# Altium schematic symbol library Regulator_Linear.SchLib: 1452 symbols (part 10 of 10)
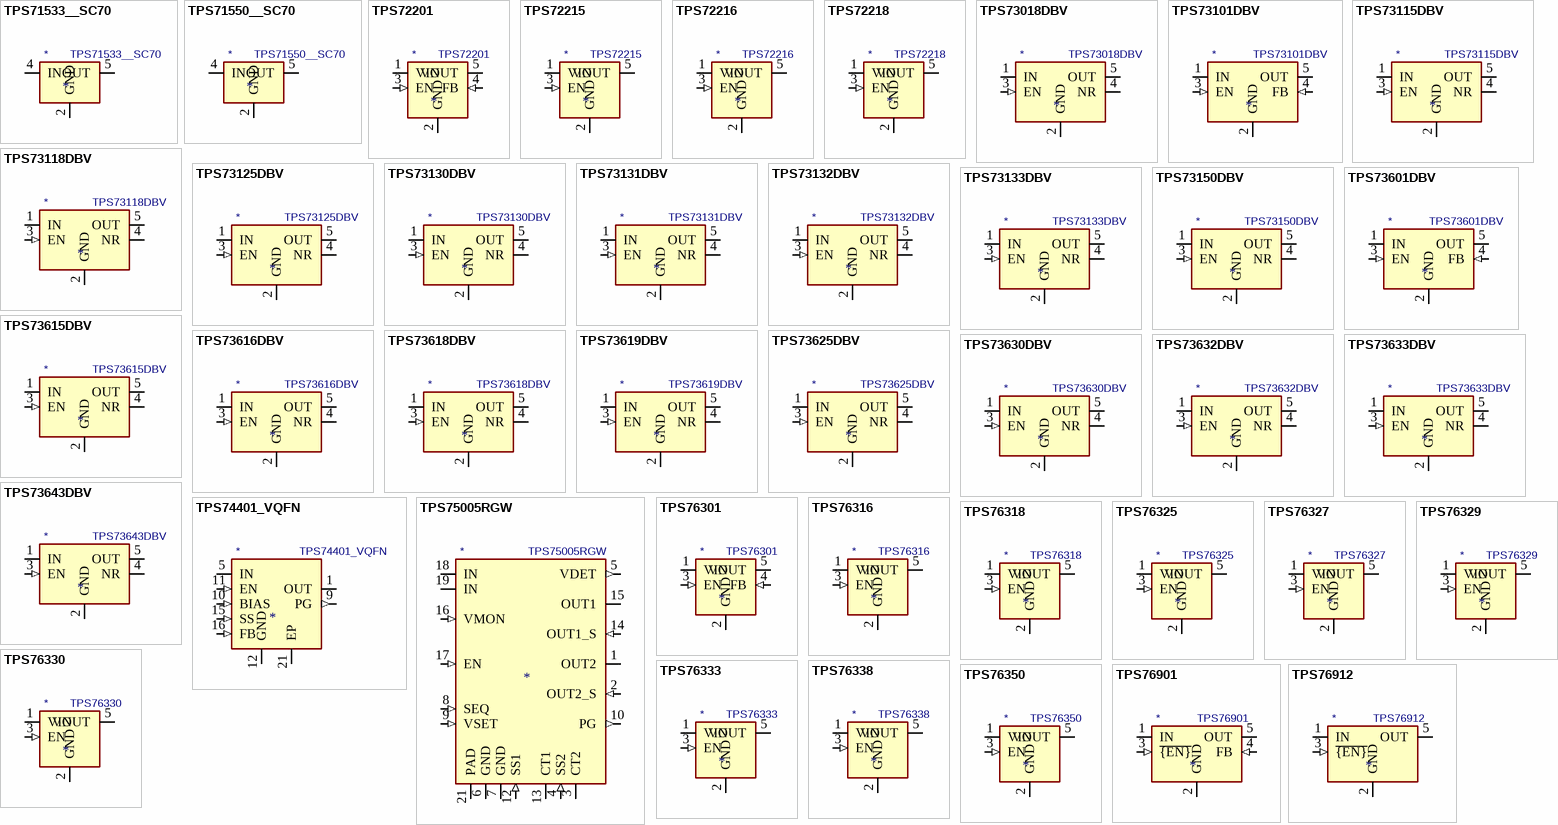
[diagram p45: symbols TPS71533__SC70 to TPS76912]

## TPS76327
designator *  value TPS76327
ki_keywords: linear low dropout Regulator fixed; ki_description: Low power 150mA LDO 2.7V fixed output voltage, SOT-23-5; ki_fp_filters: SOT?23*; Footprint: Package_TO_SOT_SMD:SOT-23-5; Supplier: http://www.ti.com/lit/ds/symlink/tps763.pdf
footprint SOT-23-5
pins: 1 VIN (power), 2 GND (power), 3 EN (in), 4 NC (in) hidden, 5 VOUT (power)

## TPS76329
designator *  value TPS76329
ki_keywords: linear low dropout Regulator fixed; ki_description: Low power 150mA LDO 2.8V fixed output voltage, SOT-23-5; ki_fp_filters: SOT?23*; Footprint: Package_TO_SOT_SMD:SOT-23-5; Supplier: http://www.ti.com/lit/ds/symlink/tps763.pdf
footprint SOT-23-5
pins: 1 VIN (power), 2 GND (power), 3 EN (in), 4 NC (in) hidden, 5 VOUT (power)

## TPS76330
designator *  value TPS76330
ki_keywords: linear low dropout Regulator fixed; ki_description: Low power 150mA LDO 3.0V fixed output voltage, SOT-23-5; ki_fp_filters: SOT?23*; Footprint: Package_TO_SOT_SMD:SOT-23-5; Supplier: http://www.ti.com/lit/ds/symlink/tps763.pdf
footprint SOT-23-5
pins: 1 VIN (power), 2 GND (power), 3 EN (in), 4 NC (in) hidden, 5 VOUT (power)

## TPS76333
designator *  value TPS76333
ki_keywords: linear low dropout Regulator fixed; ki_description: Low power 150mA LDO 3.3V fixed output voltage, SOT-23-5; ki_fp_filters: SOT?23*; Footprint: Package_TO_SOT_SMD:SOT-23-5; Supplier: http://www.ti.com/lit/ds/symlink/tps763.pdf
footprint SOT-23-5
pins: 1 VIN (power), 2 GND (power), 3 EN (in), 4 NC (in) hidden, 5 VOUT (power)

## TPS76338
designator *  value TPS76338
ki_keywords: linear low dropout Regulator fixed; ki_description: Low power 150mA LDO 3.8V fixed output voltage, SOT-23-5; ki_fp_filters: SOT?23*; Footprint: Package_TO_SOT_SMD:SOT-23-5; Supplier: http://www.ti.com/lit/ds/symlink/tps763.pdf
footprint SOT-23-5
pins: 1 VIN (power), 2 GND (power), 3 EN (in), 4 NC (in) hidden, 5 VOUT (power)

## TPS76350
designator *  value TPS76350
ki_keywords: linear low dropout Regulator fixed; ki_description: Low power 150mA LDO 5.0V fixed output voltage, SOT-23-5; ki_fp_filters: SOT?23*; Footprint: Package_TO_SOT_SMD:SOT-23-5; Supplier: http://www.ti.com/lit/ds/symlink/tps763.pdf
footprint SOT-23-5
pins: 1 VIN (power), 2 GND (power), 3 EN (in), 4 NC (in) hidden, 5 VOUT (power)

## TPS76901
designator *  value TPS76901
ki_keywords: Ultra Low Power Adjustable LDO 100mA; ki_description: Ultra Low Power 100mA Low Drop Adjustable Out Regulator, SOT-23-5; ki_fp_filters: SOT?23*; Footprint: Package_TO_SOT_SMD:SOT-23-5; Supplier: http://www.ti.com/lit/ds/symlink/tps769.pdf
footprint SOT-23-5
pins: 1 IN (power), 2 GND (power), 3 ~{{EN}} (in), 4 FB (in), 5 OUT (power)

## TPS76912
designator *  value TPS76912
ki_keywords: Ultra Low Power Fixed LDO 100mA; ki_description: Ultra Low Power 100mA Low Drop Out Regulator 1.2V, SOT-23-5; ki_fp_filters: SOT?23*; Footprint: Package_TO_SOT_SMD:SOT-23-5; Supplier: http://www.ti.com/lit/ds/symlink/tps769.pdf
footprint SOT-23-5
pins: 1 IN (power), 2 GND (power), 3 ~{{EN}} (in), 4 NC (in) hidden, 5 OUT (power)

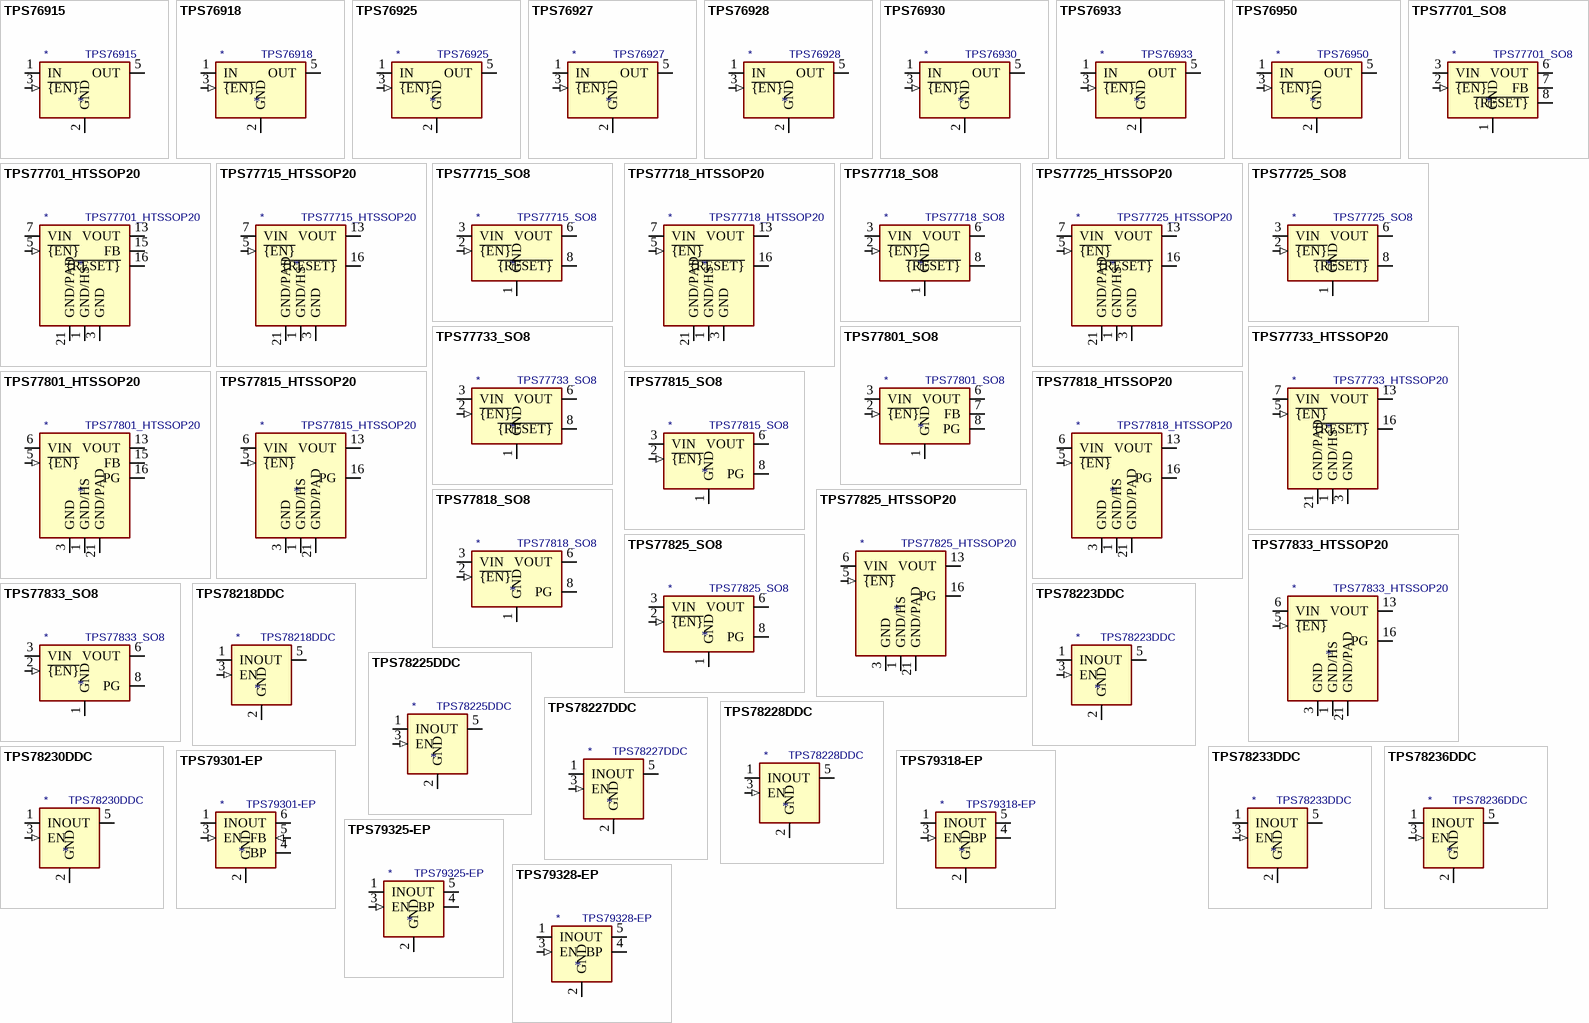
[diagram p35: symbols TPS76915 to TPS79328-EP]

## TPS76915
designator *  value TPS76915
ki_keywords: Ultra Low Power Fixed LDO 100mA; ki_description: Ultra Low Power 100mA Low Drop Out Regulator 1.5V, SOT-23-5; ki_fp_filters: SOT?23*; Footprint: Package_TO_SOT_SMD:SOT-23-5; Supplier: http://www.ti.com/lit/ds/symlink/tps769.pdf
footprint SOT-23-5
pins: 1 IN (power), 2 GND (power), 3 ~{{EN}} (in), 4 NC (in) hidden, 5 OUT (power)

## TPS76918
designator *  value TPS76918
ki_keywords: Ultra Low Power Fixed LDO 100mA; ki_description: Ultra Low Power 100mA Low Drop Out Regulator 1.8V, SOT-23-5; ki_fp_filters: SOT?23*; Footprint: Package_TO_SOT_SMD:SOT-23-5; Supplier: http://www.ti.com/lit/ds/symlink/tps769.pdf
footprint SOT-23-5
pins: 1 IN (power), 2 GND (power), 3 ~{{EN}} (in), 4 NC (in) hidden, 5 OUT (power)

## TPS76925
designator *  value TPS76925
ki_keywords: Ultra Low Power Fixed LDO 100mA; ki_description: Ultra Low Power 100mA Low Drop Out Regulator 2.5V, SOT-23-5; ki_fp_filters: SOT?23*; Footprint: Package_TO_SOT_SMD:SOT-23-5; Supplier: http://www.ti.com/lit/ds/symlink/tps769.pdf
footprint SOT-23-5
pins: 1 IN (power), 2 GND (power), 3 ~{{EN}} (in), 4 NC (in) hidden, 5 OUT (power)

## TPS76927
designator *  value TPS76927
ki_keywords: Ultra Low Power Fixed LDO 100mA; ki_description: Ultra Low Power 100mA Low Drop Out Regulator 2.7V, SOT-23-5; ki_fp_filters: SOT?23*; Footprint: Package_TO_SOT_SMD:SOT-23-5; Supplier: http://www.ti.com/lit/ds/symlink/tps769.pdf
footprint SOT-23-5
pins: 1 IN (power), 2 GND (power), 3 ~{{EN}} (in), 4 NC (in) hidden, 5 OUT (power)

## TPS76928
designator *  value TPS76928
ki_keywords: Ultra Low Power Fixed LDO 100mA; ki_description: Ultra Low Power 100mA Low Drop Out Regulator 2.8V, SOT-23-5; ki_fp_filters: SOT?23*; Footprint: Package_TO_SOT_SMD:SOT-23-5; Supplier: http://www.ti.com/lit/ds/symlink/tps769.pdf
footprint SOT-23-5
pins: 1 IN (power), 2 GND (power), 3 ~{{EN}} (in), 4 NC (in) hidden, 5 OUT (power)

## TPS76930
designator *  value TPS76930
ki_keywords: Ultra Low Power Fixed LDO 100mA; ki_description: Ultra Low Power 100mA Low Drop Out Regulator 3.0V, SOT-23-5; ki_fp_filters: SOT?23*; Footprint: Package_TO_SOT_SMD:SOT-23-5; Supplier: http://www.ti.com/lit/ds/symlink/tps769.pdf
footprint SOT-23-5
pins: 1 IN (power), 2 GND (power), 3 ~{{EN}} (in), 4 NC (in) hidden, 5 OUT (power)

## TPS76933
designator *  value TPS76933
ki_keywords: Ultra Low Power Fixed LDO 100mA; ki_description: Ultra Low Power 100mA Low Drop Out Regulator 3.3V, SOT-23-5; ki_fp_filters: SOT?23*; Footprint: Package_TO_SOT_SMD:SOT-23-5; Supplier: http://www.ti.com/lit/ds/symlink/tps769.pdf
footprint SOT-23-5
pins: 1 IN (power), 2 GND (power), 3 ~{{EN}} (in), 4 NC (in) hidden, 5 OUT (power)

## TPS76950
designator *  value TPS76950
ki_keywords: Ultra Low Power Fixed LDO 100mA 5V; ki_description: Ultra Low Power 100mA Low Drop Out Regulator 5.0V, SOT-23-5; ki_fp_filters: SOT?23*; Footprint: Package_TO_SOT_SMD:SOT-23-5; Supplier: http://www.ti.com/lit/ds/symlink/tps769.pdf
footprint SOT-23-5
pins: 1 IN (power), 2 GND (power), 3 ~{{EN}} (in), 4 NC (in) hidden, 5 OUT (power)

## TPS77701_HTSSOP20
designator *  value TPS77701_HTSSOP20
ki_keywords: 750mA LDO Regulator Adjustable Positive; ki_description: 750mA Fast-Transient Low Dropout Voltage Regulator, Adjustable Output 1.5-5.5V, HTSSOP20; ki_fp_filters: HTSSOP*4.4x6.5mm*P0.65mm*; Footprint: Package_SO:HTSSOP-20-1EP_4.4x6.5mm_P0.65mm_EP3.4x6.5mm_ThermalVias; Supplier: http://www.ti.com/lit/ds/symlink/tps777.pdf
footprint HTSSOP-20-1EP_4.4x6.5mm_P0.65mm_EP3.4x6.5mm_ThermalVias
pins: 1 GND/HS (power), 2 GND/HS hidden, 3 GND (power), 4 NC (in) hidden, 5 ~{{EN}} (in), 6 VIN hidden, 7 VIN (power), 8 NC (in) hidden, 9 GND/HS hidden, 10 GND/HS hidden, 11 GND/HS hidden, 12 GND/HS hidden, 13 VOUT (power), 14 VOUT hidden, 15 FB, 16 ~{{RESET}} (oc), 17 NC (in) hidden, 18 NC (in) hidden, 19 GND/HS hidden, 20 GND/HS hidden, 21 GND/PAD (power)

## TPS77701_SO8
designator *  value TPS77701_SO8
ki_keywords: 750mA LDO Regulator Adjustable Positive; ki_description: 750mA Fast-Transient Low Dropout Voltage Regulator, Adjustable Output 1.5-5.5V, SO-8; ki_fp_filters: SOIC*3.9x4.9mm*P1.27mm*; Footprint: Package_SO:SOIC-8_3.9x4.9mm_P1.27mm; Supplier: http://www.ti.com/lit/ds/symlink/tps777.pdf
footprint SOIC-8_3.9x4.9mm_P1.27mm
pins: 1 GND (power), 2 ~{{EN}} (in), 3 VIN (power), 4 VIN hidden, 5 VOUT hidden, 6 VOUT (power), 7 FB, 8 ~{{RESET}} (oc)

## TPS77715_HTSSOP20
designator *  value TPS77715_HTSSOP20
ki_keywords: 750mA LDO Regulator Fixed Positive; ki_description: 750mA Fast-Transient Low Dropout Voltage Regulator, Fixed Output 1.5V, HTSSOP20; ki_fp_filters: HTSSOP*4.4x6.5mm*P0.65mm*; Footprint: Package_SO:HTSSOP-20-1EP_4.4x6.5mm_P0.65mm_EP3.4x6.5mm_ThermalVias; Supplier: http://www.ti.com/lit/ds/symlink/tps777.pdf
footprint HTSSOP-20-1EP_4.4x6.5mm_P0.65mm_EP3.4x6.5mm_ThermalVias
pins: 1 GND/HS (power), 2 GND/HS hidden, 3 GND (power), 4 NC (in) hidden, 5 ~{{EN}} (in), 6 VIN hidden, 7 VIN (power), 8 NC (in) hidden, 9 GND/HS hidden, 10 GND/HS hidden, 11 GND/HS hidden, 12 GND/HS hidden, 13 VOUT (power), 14 VOUT hidden, 15 NC (in) hidden, 16 ~{{RESET}} (oc), 17 NC (in) hidden, 18 NC (in) hidden, 19 GND/HS hidden, 20 GND/HS hidden, 21 GND/PAD (power)

## TPS77715_SO8
designator *  value TPS77715_SO8
ki_keywords: 750mA LDO Regulator Fixed Positive; ki_description: 750mA Fast-Transient Low Dropout Voltage Regulator, Fixed Output 1.5V, SO-8; ki_fp_filters: SOIC*3.9x4.9mm*P1.27mm*; Footprint: Package_SO:SOIC-8_3.9x4.9mm_P1.27mm; Supplier: http://www.ti.com/lit/ds/symlink/tps777.pdf
footprint SOIC-8_3.9x4.9mm_P1.27mm
pins: 1 GND (power), 2 ~{{EN}} (in), 3 VIN (power), 4 VIN hidden, 5 VOUT hidden, 6 VOUT (power), 7 NC (in) hidden, 8 ~{{RESET}} (oc)

## TPS77718_HTSSOP20
designator *  value TPS77718_HTSSOP20
ki_keywords: 750mA LDO Regulator Fixed Positive; ki_description: 750mA Fast-Transient Low Dropout Voltage Regulator, Fixed Output 1.8V, HTSSOP20; ki_fp_filters: HTSSOP*4.4x6.5mm*P0.65mm*; Footprint: Package_SO:HTSSOP-20-1EP_4.4x6.5mm_P0.65mm_EP3.4x6.5mm_ThermalVias; Supplier: http://www.ti.com/lit/ds/symlink/tps777.pdf
footprint HTSSOP-20-1EP_4.4x6.5mm_P0.65mm_EP3.4x6.5mm_ThermalVias
pins: 1 GND/HS (power), 2 GND/HS hidden, 3 GND (power), 4 NC (in) hidden, 5 ~{{EN}} (in), 6 VIN hidden, 7 VIN (power), 8 NC (in) hidden, 9 GND/HS hidden, 10 GND/HS hidden, 11 GND/HS hidden, 12 GND/HS hidden, 13 VOUT (power), 14 VOUT hidden, 15 NC (in) hidden, 16 ~{{RESET}} (oc), 17 NC (in) hidden, 18 NC (in) hidden, 19 GND/HS hidden, 20 GND/HS hidden, 21 GND/PAD (power)

## TPS77718_SO8
designator *  value TPS77718_SO8
ki_keywords: 750mA LDO Regulator Fixed Positive; ki_description: 750mA Fast-Transient Low Dropout Voltage Regulator, Fixed Output 1.8V, SO-8; ki_fp_filters: SOIC*3.9x4.9mm*P1.27mm*; Footprint: Package_SO:SOIC-8_3.9x4.9mm_P1.27mm; Supplier: http://www.ti.com/lit/ds/symlink/tps777.pdf
footprint SOIC-8_3.9x4.9mm_P1.27mm
pins: 1 GND (power), 2 ~{{EN}} (in), 3 VIN (power), 4 VIN hidden, 5 VOUT hidden, 6 VOUT (power), 7 NC (in) hidden, 8 ~{{RESET}} (oc)

## TPS77725_HTSSOP20
designator *  value TPS77725_HTSSOP20
ki_keywords: 750mA LDO Regulator Fixed Positive; ki_description: 750mA Fast-Transient Low Dropout Voltage Regulator, Fixed Output 2.5V, HTSSOP20; ki_fp_filters: HTSSOP*4.4x6.5mm*P0.65mm*; Footprint: Package_SO:HTSSOP-20-1EP_4.4x6.5mm_P0.65mm_EP3.4x6.5mm_ThermalVias; Supplier: http://www.ti.com/lit/ds/symlink/tps777.pdf
footprint HTSSOP-20-1EP_4.4x6.5mm_P0.65mm_EP3.4x6.5mm_ThermalVias
pins: 1 GND/HS (power), 2 GND/HS hidden, 3 GND (power), 4 NC (in) hidden, 5 ~{{EN}} (in), 6 VIN hidden, 7 VIN (power), 8 NC (in) hidden, 9 GND/HS hidden, 10 GND/HS hidden, 11 GND/HS hidden, 12 GND/HS hidden, 13 VOUT (power), 14 VOUT hidden, 15 NC (in) hidden, 16 ~{{RESET}} (oc), 17 NC (in) hidden, 18 NC (in) hidden, 19 GND/HS hidden, 20 GND/HS hidden, 21 GND/PAD (power)

## TPS77725_SO8
designator *  value TPS77725_SO8
ki_keywords: 750mA LDO Regulator Fixed Positive; ki_description: 750mA Fast-Transient Low Dropout Voltage Regulator, Fixed Output 2.5V, SO-8; ki_fp_filters: SOIC*3.9x4.9mm*P1.27mm*; Footprint: Package_SO:SOIC-8_3.9x4.9mm_P1.27mm; Supplier: http://www.ti.com/lit/ds/symlink/tps777.pdf
footprint SOIC-8_3.9x4.9mm_P1.27mm
pins: 1 GND (power), 2 ~{{EN}} (in), 3 VIN (power), 4 VIN hidden, 5 VOUT hidden, 6 VOUT (power), 7 NC (in) hidden, 8 ~{{RESET}} (oc)

## TPS77733_HTSSOP20
designator *  value TPS77733_HTSSOP20
ki_keywords: 750mA LDO Regulator Fixed Positive; ki_description: 750mA Fast-Transient Low Dropout Voltage Regulator, Fixed Output 3.3V, HTSSOP20; ki_fp_filters: HTSSOP*4.4x6.5mm*P0.65mm*; Footprint: Package_SO:HTSSOP-20-1EP_4.4x6.5mm_P0.65mm_EP3.4x6.5mm_ThermalVias; Supplier: http://www.ti.com/lit/ds/symlink/tps777.pdf
footprint HTSSOP-20-1EP_4.4x6.5mm_P0.65mm_EP3.4x6.5mm_ThermalVias
pins: 1 GND/HS (power), 2 GND/HS hidden, 3 GND (power), 4 NC (in) hidden, 5 ~{{EN}} (in), 6 VIN hidden, 7 VIN (power), 8 NC (in) hidden, 9 GND/HS hidden, 10 GND/HS hidden, 11 GND/HS hidden, 12 GND/HS hidden, 13 VOUT (power), 14 VOUT hidden, 15 NC (in) hidden, 16 ~{{RESET}} (oc), 17 NC (in) hidden, 18 NC (in) hidden, 19 GND/HS hidden, 20 GND/HS hidden, 21 GND/PAD (power)

## TPS77733_SO8
designator *  value TPS77733_SO8
ki_keywords: 750mA LDO Regulator Fixed Positive; ki_description: 750mA Fast-Transient Low Dropout Voltage Regulator, Fixed Output 3.3V, SO-8; ki_fp_filters: SOIC*3.9x4.9mm*P1.27mm*; Footprint: Package_SO:SOIC-8_3.9x4.9mm_P1.27mm; Supplier: http://www.ti.com/lit/ds/symlink/tps777.pdf
footprint SOIC-8_3.9x4.9mm_P1.27mm
pins: 1 GND (power), 2 ~{{EN}} (in), 3 VIN (power), 4 VIN hidden, 5 VOUT hidden, 6 VOUT (power), 7 NC (in) hidden, 8 ~{{RESET}} (oc)

## TPS77801_HTSSOP20
designator *  value TPS77801_HTSSOP20
ki_keywords: 750mA LDO Regulator Adjustable Positive; ki_description: 750mA Fast-Transient Low Dropout Voltage Regulator, Adjustable Output 1.2-5.5V, HTSSOP20; ki_fp_filters: HTSSOP*4.4x6.5mm*P0.65mm*; Footprint: Package_SO:HTSSOP-20-1EP_4.4x6.5mm_P0.65mm_EP3.4x6.5mm_ThermalVias; Supplier: http://www.ti.com/lit/ds/symlink/tps777.pdf
footprint HTSSOP-20-1EP_4.4x6.5mm_P0.65mm_EP3.4x6.5mm_ThermalVias
pins: 1 GND/HS (power), 2 GND/HS hidden, 3 GND (power), 4 NC (in) hidden, 5 ~{{EN}} (in), 6 VIN (power), 7 VIN hidden, 8 NC (in) hidden, 9 GND/HS hidden, 10 GND/HS hidden, 11 GND/HS hidden, 12 GND/HS hidden, 13 VOUT (power), 14 VOUT hidden, 15 FB, 16 PG (oc), 17 NC (in) hidden, 18 NC (in) hidden, 19 GND/HS hidden, 20 GND/HS hidden, 21 GND/PAD (power)

## TPS77801_SO8
designator *  value TPS77801_SO8
ki_keywords: 750mA LDO Regulator Adjustable Positive; ki_description: 750mA Fast-Transient Low Dropout Voltage Regulator, Adjustable Output 1.2-5.5V, SO-8; ki_fp_filters: SOIC*3.9x4.9mm*P1.27mm*; Footprint: Package_SO:SOIC-8_3.9x4.9mm_P1.27mm; Supplier: http://www.ti.com/lit/ds/symlink/tps777.pdf
footprint SOIC-8_3.9x4.9mm_P1.27mm
pins: 1 GND (power), 2 ~{{EN}} (in), 3 VIN (power), 4 VIN hidden, 5 VOUT hidden, 6 VOUT (power), 7 FB, 8 PG (oc)

## TPS77815_HTSSOP20
designator *  value TPS77815_HTSSOP20
ki_keywords: 750mA LDO Regulator Fixed Positive; ki_description: 750mA Fast-Transient Low Dropout Voltage Regulator, Fixed Output 1.5V, HTSSOP20; ki_fp_filters: HTSSOP*4.4x6.5mm*P0.65mm*; Footprint: Package_SO:HTSSOP-20-1EP_4.4x6.5mm_P0.65mm_EP3.4x6.5mm_ThermalVias; Supplier: http://www.ti.com/lit/ds/symlink/tps777.pdf
footprint HTSSOP-20-1EP_4.4x6.5mm_P0.65mm_EP3.4x6.5mm_ThermalVias
pins: 1 GND/HS (power), 2 GND/HS hidden, 3 GND (power), 4 NC (in) hidden, 5 ~{{EN}} (in), 6 VIN (power), 7 VIN hidden, 8 NC (in) hidden, 9 GND/HS hidden, 10 GND/HS hidden, 11 GND/HS hidden, 12 GND/HS hidden, 13 VOUT (power), 14 VOUT hidden, 15 NC (in) hidden, 16 PG (oc), 17 NC (in) hidden, 18 NC (in) hidden, 19 GND/HS hidden, 20 GND/HS hidden, 21 GND/PAD (power)

## TPS77815_SO8
designator *  value TPS77815_SO8
ki_keywords: 750mA LDO Regulator Fixed Positive; ki_description: 750mA Fast-Transient Low Dropout Voltage Regulator, Fixed Output 1.5V, SO-8; ki_fp_filters: SOIC*3.9x4.9mm*P1.27mm*; Footprint: Package_SO:SOIC-8_3.9x4.9mm_P1.27mm; Supplier: http://www.ti.com/lit/ds/symlink/tps777.pdf
footprint SOIC-8_3.9x4.9mm_P1.27mm
pins: 1 GND (power), 2 ~{{EN}} (in), 3 VIN (power), 4 VIN hidden, 5 VOUT hidden, 6 VOUT (power), 7 NC (in) hidden, 8 PG (oc)

## TPS77818_HTSSOP20
designator *  value TPS77818_HTSSOP20
ki_keywords: 750mA LDO Regulator Fixed Positive; ki_description: 750mA Fast-Transient Low Dropout Voltage Regulator, Fixed Output 1.8V, HTSSOP20; ki_fp_filters: HTSSOP*4.4x6.5mm*P0.65mm*; Footprint: Package_SO:HTSSOP-20-1EP_4.4x6.5mm_P0.65mm_EP3.4x6.5mm_ThermalVias; Supplier: http://www.ti.com/lit/ds/symlink/tps777.pdf
footprint HTSSOP-20-1EP_4.4x6.5mm_P0.65mm_EP3.4x6.5mm_ThermalVias
pins: 1 GND/HS (power), 2 GND/HS hidden, 3 GND (power), 4 NC (in) hidden, 5 ~{{EN}} (in), 6 VIN (power), 7 VIN hidden, 8 NC (in) hidden, 9 GND/HS hidden, 10 GND/HS hidden, 11 GND/HS hidden, 12 GND/HS hidden, 13 VOUT (power), 14 VOUT hidden, 15 NC (in) hidden, 16 PG (oc), 17 NC (in) hidden, 18 NC (in) hidden, 19 GND/HS hidden, 20 GND/HS hidden, 21 GND/PAD (power)

## TPS77818_SO8
designator *  value TPS77818_SO8
ki_keywords: 750mA LDO Regulator Fixed Positive; ki_description: 750mA Fast-Transient Low Dropout Voltage Regulator, Fixed Output 1.8V, SO-8; ki_fp_filters: SOIC*3.9x4.9mm*P1.27mm*; Footprint: Package_SO:SOIC-8_3.9x4.9mm_P1.27mm; Supplier: http://www.ti.com/lit/ds/symlink/tps777.pdf
footprint SOIC-8_3.9x4.9mm_P1.27mm
pins: 1 GND (power), 2 ~{{EN}} (in), 3 VIN (power), 4 VIN hidden, 5 VOUT hidden, 6 VOUT (power), 7 NC (in) hidden, 8 PG (oc)

## TPS77825_HTSSOP20
designator *  value TPS77825_HTSSOP20
ki_keywords: 750mA LDO Regulator Fixed Positive; ki_description: 750mA Fast-Transient Low Dropout Voltage Regulator, Fixed Output 2.5V, HTSSOP20; ki_fp_filters: HTSSOP*4.4x6.5mm*P0.65mm*; Footprint: Package_SO:HTSSOP-20-1EP_4.4x6.5mm_P0.65mm_EP3.4x6.5mm_ThermalVias; Supplier: http://www.ti.com/lit/ds/symlink/tps777.pdf
footprint HTSSOP-20-1EP_4.4x6.5mm_P0.65mm_EP3.4x6.5mm_ThermalVias
pins: 1 GND/HS (power), 2 GND/HS hidden, 3 GND (power), 4 NC (in) hidden, 5 ~{{EN}} (in), 6 VIN (power), 7 VIN hidden, 8 NC (in) hidden, 9 GND/HS hidden, 10 GND/HS hidden, 11 GND/HS hidden, 12 GND/HS hidden, 13 VOUT (power), 14 VOUT hidden, 15 NC (in) hidden, 16 PG (oc), 17 NC (in) hidden, 18 NC (in) hidden, 19 GND/HS hidden, 20 GND/HS hidden, 21 GND/PAD (power)

## TPS77825_SO8
designator *  value TPS77825_SO8
ki_keywords: 750mA LDO Regulator Fixed Positive; ki_description: 750mA Fast-Transient Low Dropout Voltage Regulator, Fixed Output 2.5V, SO-8; ki_fp_filters: SOIC*3.9x4.9mm*P1.27mm*; Footprint: Package_SO:SOIC-8_3.9x4.9mm_P1.27mm; Supplier: http://www.ti.com/lit/ds/symlink/tps777.pdf
footprint SOIC-8_3.9x4.9mm_P1.27mm
pins: 1 GND (power), 2 ~{{EN}} (in), 3 VIN (power), 4 VIN hidden, 5 VOUT hidden, 6 VOUT (power), 7 NC (in) hidden, 8 PG (oc)

## TPS77833_HTSSOP20
designator *  value TPS77833_HTSSOP20
ki_keywords: 750mA LDO Regulator Fixed Positive; ki_description: 750mA Fast-Transient Low Dropout Voltage Regulator, Fixed Output 3.3V, HTSSOP20; ki_fp_filters: HTSSOP*4.4x6.5mm*P0.65mm*; Footprint: Package_SO:HTSSOP-20-1EP_4.4x6.5mm_P0.65mm_EP3.4x6.5mm_ThermalVias; Supplier: http://www.ti.com/lit/ds/symlink/tps777.pdf
footprint HTSSOP-20-1EP_4.4x6.5mm_P0.65mm_EP3.4x6.5mm_ThermalVias
pins: 1 GND/HS (power), 2 GND/HS hidden, 3 GND (power), 4 NC (in) hidden, 5 ~{{EN}} (in), 6 VIN (power), 7 VIN hidden, 8 NC (in) hidden, 9 GND/HS hidden, 10 GND/HS hidden, 11 GND/HS hidden, 12 GND/HS hidden, 13 VOUT (power), 14 VOUT hidden, 15 NC (in) hidden, 16 PG (oc), 17 NC (in) hidden, 18 NC (in) hidden, 19 GND/HS hidden, 20 GND/HS hidden, 21 GND/PAD (power)

## TPS77833_SO8
designator *  value TPS77833_SO8
ki_keywords: 750mA LDO Regulator Fixed Positive; ki_description: 750mA Fast-Transient Low Dropout Voltage Regulator, Fixed Output 3.3V, SO-8; ki_fp_filters: SOIC*3.9x4.9mm*P1.27mm*; Footprint: Package_SO:SOIC-8_3.9x4.9mm_P1.27mm; Supplier: http://www.ti.com/lit/ds/symlink/tps777.pdf
footprint SOIC-8_3.9x4.9mm_P1.27mm
pins: 1 GND (power), 2 ~{{EN}} (in), 3 VIN (power), 4 VIN hidden, 5 VOUT hidden, 6 VOUT (power), 7 NC (in) hidden, 8 PG (oc)

## TPS78218DDC
designator *  value TPS78218DDC
ki_keywords: Single Output LDO Low-Iq; ki_description: 150-mA, 500nA Ultra-Low-IQ LDO, 1.8V, SOT-23-5; ki_fp_filters: SOT?23*; Footprint: Package_TO_SOT_SMD:SOT-23-5; Supplier: http://www.ti.com/lit/gpn/tps782
footprint SOT-23-5
pins: 1 IN (power), 2 GND (power), 3 EN (in), 4 GND hidden, 5 OUT (power)

## TPS78223DDC
designator *  value TPS78223DDC
ki_keywords: Single Output LDO Low-Iq; ki_description: 150-mA, 500nA Ultra-Low-IQ LDO, 2.3V, SOT-23-5; ki_fp_filters: SOT?23*; Footprint: Package_TO_SOT_SMD:SOT-23-5; Supplier: http://www.ti.com/lit/gpn/tps782
footprint SOT-23-5
pins: 1 IN (power), 2 GND (power), 3 EN (in), 4 GND hidden, 5 OUT (power)

## TPS78225DDC
designator *  value TPS78225DDC
ki_keywords: Single Output LDO Low-Iq; ki_description: 150-mA, 500nA Ultra-Low-IQ LDO, 2.5V, SOT-23-5; ki_fp_filters: SOT?23*; Footprint: Package_TO_SOT_SMD:SOT-23-5; Supplier: http://www.ti.com/lit/gpn/tps782
footprint SOT-23-5
pins: 1 IN (power), 2 GND (power), 3 EN (in), 4 GND hidden, 5 OUT (power)

## TPS78227DDC
designator *  value TPS78227DDC
ki_keywords: Single Output LDO Low-Iq; ki_description: 150-mA, 500nA Ultra-Low-IQ LDO, 2.7V, SOT-23-5; ki_fp_filters: SOT?23*; Footprint: Package_TO_SOT_SMD:SOT-23-5; Supplier: http://www.ti.com/lit/gpn/tps782
footprint SOT-23-5
pins: 1 IN (power), 2 GND (power), 3 EN (in), 4 GND hidden, 5 OUT (power)

## TPS78228DDC
designator *  value TPS78228DDC
ki_keywords: Single Output LDO Low-Iq; ki_description: 150-mA, 500nA Ultra-Low-IQ LDO, 2.8V, SOT-23-5; ki_fp_filters: SOT?23*; Footprint: Package_TO_SOT_SMD:SOT-23-5; Supplier: http://www.ti.com/lit/gpn/tps782
footprint SOT-23-5
pins: 1 IN (power), 2 GND (power), 3 EN (in), 4 GND hidden, 5 OUT (power)

## TPS78230DDC
designator *  value TPS78230DDC
ki_keywords: Single Output LDO Low-Iq; ki_description: 150-mA, 500nA Ultra-Low-IQ LDO, 3.0V, SOT-23-5; ki_fp_filters: SOT?23*; Footprint: Package_TO_SOT_SMD:SOT-23-5; Supplier: http://www.ti.com/lit/gpn/tps782
footprint SOT-23-5
pins: 1 IN (power), 2 GND (power), 3 EN (in), 4 GND hidden, 5 OUT (power)

## TPS78233DDC
designator *  value TPS78233DDC
ki_keywords: Single Output LDO Low-Iq; ki_description: 150-mA, 500nA Ultra-Low-IQ LDO, 3.3V, SOT-23-5; ki_fp_filters: SOT?23*; Footprint: Package_TO_SOT_SMD:SOT-23-5; Supplier: http://www.ti.com/lit/gpn/tps782
footprint SOT-23-5
pins: 1 IN (power), 2 GND (power), 3 EN (in), 4 GND hidden, 5 OUT (power)

## TPS78236DDC
designator *  value TPS78236DDC
ki_keywords: Single Output LDO Low-Iq; ki_description: 150-mA, 500nA Ultra-Low-IQ LDO, 3.6V, SOT-23-5; ki_fp_filters: SOT?23*; Footprint: Package_TO_SOT_SMD:SOT-23-5; Supplier: http://www.ti.com/lit/gpn/tps782
footprint SOT-23-5
pins: 1 IN (power), 2 GND (power), 3 EN (in), 4 GND hidden, 5 OUT (power)

## TPS79301-EP
designator *  value TPS79301-EP
ki_keywords: LDO Voltage Regulator 200mA adjustable; ki_description: 200mA UltraLow-Noise, High-Precision, Fast RF, Low Drop-out Voltage Regulator, Adjustable Output, SOT-23; ki_fp_filters: SOT?23*; Footprint: Package_TO_SOT_SMD:SOT-23-6; Supplier: http://www.ti.com/lit/ds/symlink/tps79333-ep.pdf
footprint SOT-23-6
pins: 1 IN (power), 2 GND (power), 3 EN (in), 4 BP, 5 FB (in), 6 OUT (power)

## TPS79318-EP
designator *  value TPS79318-EP
ki_keywords: LDO Voltage Regulator 200mA; ki_description: 200mA UltraLow-Noise, High-Precision, Fast RF, Low Drop-out Voltage Regulator, Fixed Output 1.8V, SOT-23; ki_fp_filters: SOT?23*; Footprint: Package_TO_SOT_SMD:SOT-23-5; Supplier: http://www.ti.com/lit/ds/symlink/tps79333-ep.pdf
footprint SOT-23-5
pins: 1 IN (power), 2 GND (power), 3 EN (in), 4 BP (io), 5 OUT (power)

## TPS79325-EP
designator *  value TPS79325-EP
ki_keywords: LDO Voltage Regulator 200mA; ki_description: 200mA UltraLow-Noise, High-Precision, Fast RF, Low Drop-out Voltage Regulator, Fixed Output 2.5V, SOT-23; ki_fp_filters: SOT?23*; Footprint: Package_TO_SOT_SMD:SOT-23-5; Supplier: http://www.ti.com/lit/ds/symlink/tps79333-ep.pdf
footprint SOT-23-5
pins: 1 IN (power), 2 GND (power), 3 EN (in), 4 BP (io), 5 OUT (power)

## TPS79328-EP
designator *  value TPS79328-EP
ki_keywords: LDO Voltage Regulator 200mA; ki_description: 200mA UltraLow-Noise, High-Precision, Fast RF, Low Drop-out Voltage Regulator, Fixed Output 2.8V, SOT-23; ki_fp_filters: SOT?23*; Footprint: Package_TO_SOT_SMD:SOT-23-5; Supplier: http://www.ti.com/lit/ds/symlink/tps79333-ep.pdf
footprint SOT-23-5
pins: 1 IN (power), 2 GND (power), 3 EN (in), 4 BP (io), 5 OUT (power)

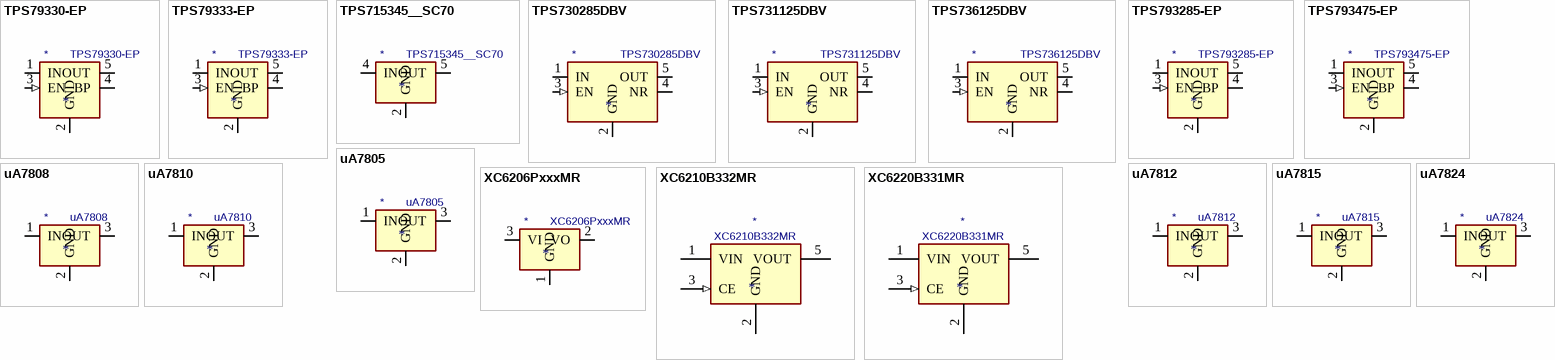
[diagram p36: symbols TPS79330-EP to XC6220B331MR]

## TPS79330-EP
designator *  value TPS79330-EP
ki_keywords: LDO Voltage Regulator 200mA; ki_description: 200mA UltraLow-Noise, High-Precision, Fast RF, Low Drop-out Voltage Regulator, Fixed Output 3.0V, SOT-23; ki_fp_filters: SOT?23*; Footprint: Package_TO_SOT_SMD:SOT-23-5; Supplier: http://www.ti.com/lit/ds/symlink/tps79333-ep.pdf
footprint SOT-23-5
pins: 1 IN (power), 2 GND (power), 3 EN (in), 4 BP (io), 5 OUT (power)

## TPS79333-EP
designator *  value TPS79333-EP
ki_keywords: LDO Voltage Regulator 200mA; ki_description: 200mA UltraLow-Noise, High-Precision, Fast RF, Low Drop-out Voltage Regulator, Fixed Output 3.3V, SOT-23; ki_fp_filters: SOT?23*; Footprint: Package_TO_SOT_SMD:SOT-23-5; Supplier: http://www.ti.com/lit/ds/symlink/tps79333-ep.pdf
footprint SOT-23-5
pins: 1 IN (power), 2 GND (power), 3 EN (in), 4 BP (io), 5 OUT (power)

## TPS715345__SC70
designator *  value TPS715345__SC70
ki_keywords: LDO regulator voltage; ki_description: Low-drop Voltage Regulator, Io up to 50mA, Fixed Vo 3.45V, Ignd 3.2uA , SC70.; ki_fp_filters: *SC?70*; Footprint: Package_TO_SOT_SMD:SOT-353_SC-70-5; Supplier: http://www.ti.com/lit/ds/symlink/tps715.pdf
footprint SOT-353_SC-70-5
pins: 1 NC (in) hidden, 2 GND (power), 3 NC (in) hidden, 4 IN (power), 5 OUT (power)

## TPS730285DBV
designator *  value TPS730285DBV
ki_keywords: Fixed LDO 200mA; ki_description: Low Noise, High PSRR, 200mA Low Drop 2.85V Regulator, SOT-23-5; ki_fp_filters: SOT?23*; Footprint: Package_TO_SOT_SMD:SOT-23-5; Supplier: https://www.ti.com/lit/ds/symlink/tps730.pdf
footprint SOT-23-5
pins: 1 IN (power), 2 GND (power), 3 EN (in), 4 NR, 5 OUT (power)

## TPS731125DBV
designator *  value TPS731125DBV
ki_keywords: Cap free Fixed LDO 150mA; ki_description: Cap free NMOS 150mA Low Drop 1.25V Regulator, SOT-23-5; ki_fp_filters: SOT?23*; Footprint: Package_TO_SOT_SMD:SOT-23-5; Supplier: http://www.ti.com/lit/ds/symlink/tps731.pdf
footprint SOT-23-5
pins: 1 IN (power), 2 GND (power), 3 EN (in), 4 NR, 5 OUT (power)

## TPS736125DBV
designator *  value TPS736125DBV
ki_keywords: Cap free Fixed LDO 400mA; ki_description: Cap free NMOS 400mA Low Drop 1.25V Regulator, SOT-23-5; ki_fp_filters: SOT?23*; Footprint: Package_TO_SOT_SMD:SOT-23-5; Supplier: http://www.ti.com/lit/ds/symlink/tps736.pdf
footprint SOT-23-5
pins: 1 IN (power), 2 GND (power), 3 EN (in), 4 NR, 5 OUT (power)

## TPS793285-EP
designator *  value TPS793285-EP
ki_keywords: LDO Voltage Regulator 200mA; ki_description: 200mA UltraLow-Noise, High-Precision, Fast RF, Low Drop-out Voltage Regulator, Fixed Output 2.85V, SOT-23; ki_fp_filters: SOT?23*; Footprint: Package_TO_SOT_SMD:SOT-23-5; Supplier: http://www.ti.com/lit/ds/symlink/tps79333-ep.pdf
footprint SOT-23-5
pins: 1 IN (power), 2 GND (power), 3 EN (in), 4 BP (io), 5 OUT (power)

## TPS793475-EP
designator *  value TPS793475-EP
ki_keywords: LDO Voltage Regulator 200mA; ki_description: 200mA UltraLow-Noise, High-Precision, Fast RF, Low Drop-out Voltage Regulator, Fixed Output 4.75V, SOT-23; ki_fp_filters: SOT?23*; Footprint: Package_TO_SOT_SMD:SOT-23-5; Supplier: http://www.ti.com/lit/ds/symlink/tps79333-ep.pdf
footprint SOT-23-5
pins: 1 IN (power), 2 GND (power), 3 EN (in), 4 BP (io), 5 OUT (power)

## uA7805
designator *  value uA7805
ki_keywords: Voltage Regulator 1A Positive; ki_description: Positive 1A 35V Linear Regulator, Fixed Output 5V, TO-220/TO-263; ki_fp_filters: TO?263* TO?220*; Supplier: http://www.ti.com/lit/ds/symlink/ua78.pdf
pins: 1 IN (power), 2 GND (power), 3 OUT (power)

## uA7808
designator *  value uA7808
ki_keywords: Voltage Regulator 1A Positive; ki_description: Positive 1A 35V Linear Regulator, Fixed Output 8V, TO-220/TO-263; ki_fp_filters: TO?263* TO?220*; Supplier: http://www.ti.com/lit/ds/symlink/ua78.pdf
pins: 1 IN (power), 2 GND (power), 3 OUT (power)

## uA7810
designator *  value uA7810
ki_keywords: Voltage Regulator 1A Positive; ki_description: Positive 1A 35V Linear Regulator, Fixed Output 10V, TO-220/TO-263; ki_fp_filters: TO?263* TO?220*; Supplier: http://www.ti.com/lit/ds/symlink/ua78.pdf
pins: 1 IN (power), 2 GND (power), 3 OUT (power)

## uA7812
designator *  value uA7812
ki_keywords: Voltage Regulator 1A Positive; ki_description: Positive 1A 35V Linear Regulator, Fixed Output 12V, TO-220/TO-263; ki_fp_filters: TO?263* TO?220*; Supplier: http://www.ti.com/lit/ds/symlink/ua78.pdf
pins: 1 IN (power), 2 GND (power), 3 OUT (power)

## uA7815
designator *  value uA7815
ki_keywords: Voltage Regulator 1A Positive; ki_description: Positive 1A 35V Linear Regulator, Fixed Output 15V, TO-220/TO-263; ki_fp_filters: TO?263* TO?220*; Supplier: http://www.ti.com/lit/ds/symlink/ua78.pdf
pins: 1 IN (power), 2 GND (power), 3 OUT (power)

## uA7824
designator *  value uA7824
ki_keywords: Voltage Regulator 1A Positive; ki_description: Positive 1A 35V Linear Regulator, Fixed Output 24V, TO-220/TO-263; ki_fp_filters: TO?263* TO?220*; Supplier: http://www.ti.com/lit/ds/symlink/ua78.pdf
pins: 1 IN (power), 2 GND (power), 3 OUT (power)

## XC6206PxxxMR
designator *  value XC6206PxxxMR
ki_keywords: Torex LDO Voltage Regulator Fixed Positive; ki_description: Positive 60-250mA Low Dropout Regulator, Fixed Output, SOT-23; ki_fp_filters: SOT?23*; Footprint: Package_TO_SOT_SMD:SOT-23; Supplier: https://www.torexsemi.com/file/xc6206/XC6206.pdf
footprint SOT-23
pins: 1 GND (power), 2 VO (power), 3 VI (power)

## XC6210B332MR
designator *  value XC6210B332MR
ki_keywords: LDO Voltage Regulator 700mA; ki_description: 700mA, Low Drop-out Voltage Regulator, Fixed Output 3.3V, SOT-23-5; ki_fp_filters: SOT?23*; Footprint: Package_TO_SOT_SMD:SOT-23-5; Supplier: https://www.torexsemi.com/file/xc6210/XC6210.pdf
footprint SOT-23-5
pins: 1 VIN (power), 2 GND (power), 3 CE (in), 4 NC (in) hidden, 5 VOUT (power)

## XC6220B331MR
designator *  value XC6220B331MR
ki_keywords: LDO Voltage Regulator 1A; ki_description: 1A, Low Drop-out Voltage Regulator, Fixed Output 3.3V, SOT-23-5; ki_fp_filters: SOT?23*; Footprint: Package_TO_SOT_SMD:SOT-23-5; Supplier: https://www.torexsemi.com/file/xc6220/XC6220.pdf
footprint SOT-23-5
pins: 1 VIN (power), 2 GND (power), 3 CE (in), 4 NC (in) hidden, 5 VOUT (power)